# Altium footprint library Rocket_library.PcbLib: 65 footprints (part 1 of 5)
Each footprint in its own frame and in the unit in brackets; x right, y up, seen from the top. Pads: shape width x height; smd on the part's side, far side on the other; paste and mask are expansions set on the pad; w line width, h text height; cw(c..) or ccw(c..) is an arc to the next point about the centre after c.
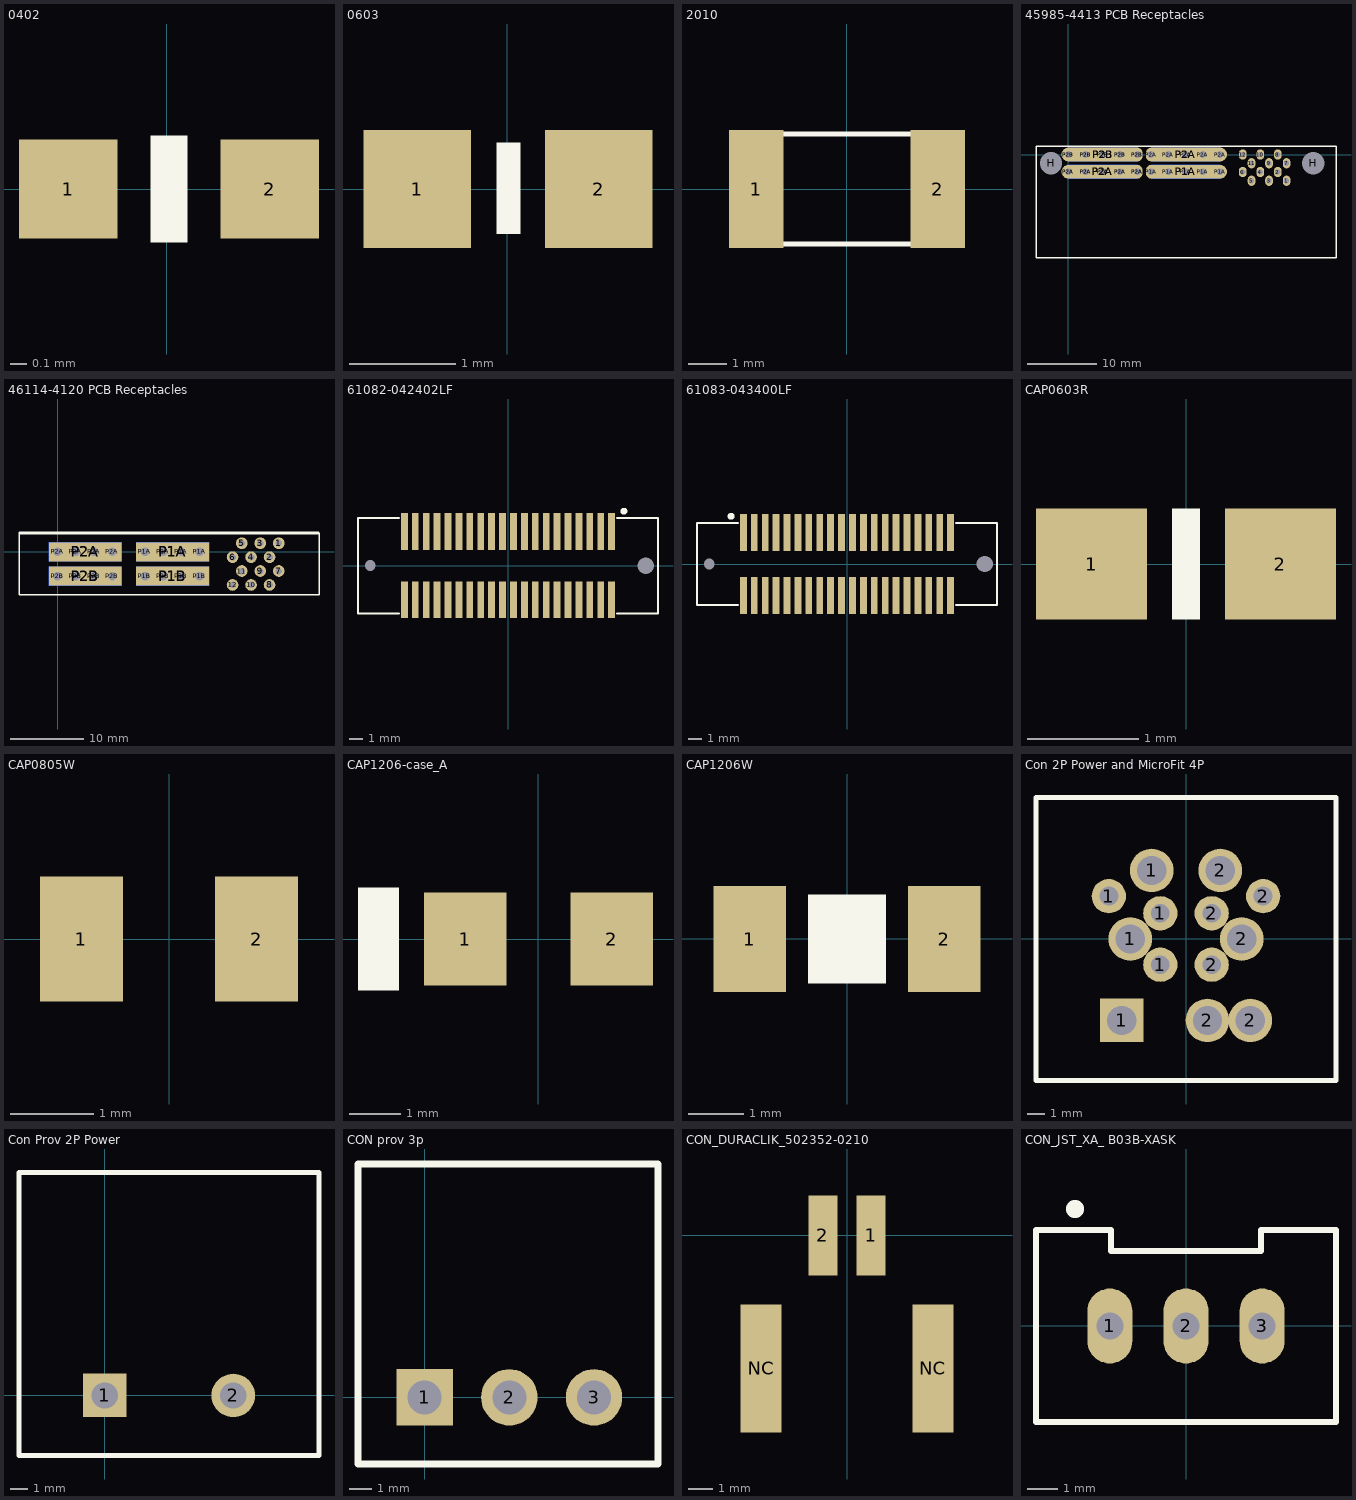
[diagram p0: the footprints below, top view; thin cyan lines are the x and y axes]

## 0402 [mm]
pads (2):
  rect 0.6x0.6 smd: 1(-0.6,0) 2(0.625,0)
Top Overlay:
  rectangle: -0.1,-0.325 0.125,0.325
3D body "CAP0402.stp": height 0.2, standoff 0, extent -0.5,-0.3 0.5,0.3

## 0603 [mil]
pads (2):
  rect 40x44 smd: 1(-33.46,0) 2(34,0)
Top Overlay:
  rectangle: -3.94,-16.73 4.92,17.27
3D body "User Library-RES_1609-0603.STEP": height 22.05, standoff 0, extent -33.46,-15.74 33.47,15.75

## 2010 [mil]
pads (2):
  rect 56x121 smd: 1(-92.52,0) 2(93,0)
Top Overlay:
  lines w5: -93.62,-56.1 94,-56.1 94,56.1 -93.62,56.1 -93.62,-56.1
3D body "User Library-R_2010.STEP": height 23.62, standoff 0, extent -98.42,-49.21 98.43,49.22

## 45985-4413 PCB Receptacles [mm] "EXTreme LPH Power™ Header, Right Angle, 4 Power Contacts, 12 Signal Contacts, Select Gold (Au) Plating, for 1.57mm Thick PC Board, with Guide Pockets, with Press-fit Plastic Pegs"
pads (56):
  oval 1.1x1.5 hole 0.75: 1(31.63,-3.81) 2(30.36,-2.54) 3(29.09,-3.81) 4(27.82,-2.54) 5(26.55,-3.81) 6(25.28,-2.54) 7(31.63,-1.27) 8(30.36,0) 9(29.09,-1.27) 10(27.82,0) 11(26.55,-1.27) 12(25.28,0)
  round 2 hole 3.2 unplated: H(-2.5,-1.27) H(35.5,-1.27)
  oval 1.5x2 hole 1: P1A(12,-2.5) P2A(10,-2.5) P2A(10,-2.5) P2A(12,0) P2B(10,0) P2B(10,0)
  round 2 hole 1: P1A(14.5,-2.5) P1A(17,-2.5) P1A(19.5,-2.5) P1A(22,-2.5) P2A(0,-2.5) P2A(0,-2.5) P2A(2.5,-2.5) P2A(2.5,-2.5) P2A(5,-2.5) P2A(5,-2.5) P2A(7.5,-2.5) P2A(7.5,-2.5) P2A(14.5,0) P2A(17,0) P2A(19.5,0) P2A(22,0) P2B(0,0) P2B(0,0) P2B(2.5,0) P2B(2.5,0) P2B(5,0) P2B(5,0) P2B(7.5,0) P2B(7.5,0)
  rect 10x2 smd: P1A(17,-2.5) P2A(5,-2.5) P2A(5,-2.5) P2A(17,0) P2B(5,0) P2B(5,0)
  rect 10x2 smd far side: P1A(17,-2.5) P2A(5,-2.5) P2A(5,-2.5) P2A(17,0) P2B(5,0) P2B(5,0)
Top Overlay:
  lines w0.2: -4.7,-15 38.8,-15 38.8,1.2 -4.7,1.2 -4.7,-15
3D body "459854413.stp": height 9.19, standoff -1.55, extent -4.805,-15.215 38.855,1.065

## 46114-4120 PCB Receptacles [mm] "1.27mm, 12.00mm Pitch, EXTreme LPHPower™ Receptacle Header, Vertical, 4 Power Contacts, 12 Signal Contacts, Select Gold (Au) Plating, with BMI Guides"
pads (36):
  round 1.6 hole 0.9: 1(30.38,1.19) 2(29.11,-0.72) 3(27.84,1.19) 4(26.57,-0.72) 5(25.3,1.19) 6(24.03,-0.72) 7(30.38,-2.63) 8(29.11,-4.54) 9(27.84,-2.63) 10(26.57,-4.54) 11(25.3,-2.63) 12(24.03,-4.54)
  round 2.184 hole 1.2: P1A(12,0) P1A(14.5,0) P1A(17,0) P1A(19.5,0) P1B(12,-3.33) P1B(14.5,-3.33) P1B(17,-3.33) P1B(19.5,-3.33) P2A(0,0) P2A(2.5,0) P2A(5,0) P2A(7.5,0) P2B(0,-3.33) P2B(2.5,-3.33) P2B(5,-3.33) P2B(7.5,-3.33)
  rect 10x2.6 smd: P1A(15.8,0) P1B(15.8,-3.33) P2A(3.8,0) P2B(3.8,-3.33)
  rect 10x2.6 smd far side: P1A(15.8,0) P1B(15.8,-3.33) P2A(3.8,0) P2B(3.8,-3.33)
Top Overlay:
  lines w0.2: -5.3,-5.9 35.9,-5.9 35.9,2.54 -5.3,2.54 -5.3,-5.9
  lines w0.4: -5.2,2.6 35.8,2.6
3D body "461144120.stp": height 18.02, standoff -2.57, extent -5.2,-5.8 35.805,2.53

## 61082-042402LF [mm] "Connecteurs carte à carte et mezzanine 40P RECPT"
pads (42):
  round 0 hole 0.8 unplated: 1(-10.1,0)
  rect 0.5x2.7 smd: 1(7.6,2.5) 2(7.6,-2.5) 3(6.8,2.5) 4(6.8,-2.5) 5(6,2.5) 6(6,-2.5) 7(5.2,2.5) 8(5.2,-2.5) 9(4.4,2.5) 10(4.4,-2.5) 11(3.6,2.5) 12(3.6,-2.5) 13(2.8,2.5) 14(2.8,-2.5) 15(2,2.5) 16(2,-2.5) 17(1.2,2.5) 18(1.2,-2.5) 19(0.4,2.5) 20(0.4,-2.5) 21(-0.4,2.5) 22(-0.4,-2.5) 23(-1.2,2.5) 24(-1.2,-2.5) 25(-2,2.5) 26(-2,-2.5) 27(-2.8,2.5) 28(-2.8,-2.5) 29(-3.6,2.5) 30(-3.6,-2.5) 31(-4.4,2.5) 32(-4.4,-2.5) 33(-5.2,2.5) 34(-5.2,-2.5) 35(-6,2.5) 36(-6,-2.5) 37(-6.8,2.5) 38(-6.8,-2.5) 39(-7.6,2.5) 40(-7.6,-2.5)
  round 0 hole 1.2 unplated: 1(10.1,0)
Top Overlay:
  circle w0.3: c8.5,4 r0.1
  lines w0.127: -8,-3.5 -11,-3.5 -11,3.5 -8,3.5 ; 8,-3.5 11,-3.5 11,3.5 8,3.5
3D body "s61082-042x0xxx.stp": height 7.65, standoff -0.7, extent -10.9,-3.4 10.9,3.4

## 61083-043400LF [mm] "Connecteurs carte à carte et mezzanine 6.70MM PLUG 40P"
pads (42):
  round 0 hole 0.8 unplated: 1(-10.1,0)
  rect 0.5x2.7 smd: 1(-7.6,2.3) 2(-7.6,-2.3) 3(-6.8,2.3) 4(-6.8,-2.3) 5(-6,2.3) 6(-6,-2.3) 7(-5.2,2.3) 8(-5.2,-2.3) 9(-4.4,2.3) 10(-4.4,-2.3) 11(-3.6,2.3) 12(-3.6,-2.3) 13(-2.8,2.3) 14(-2.8,-2.3) 15(-2,2.3) 16(-2,-2.3) 17(-1.2,2.3) 18(-1.2,-2.3) 19(-0.4,2.3) 20(-0.4,-2.3) 21(0.4,2.3) 22(0.4,-2.3) 23(1.2,2.3) 24(1.2,-2.3) 25(2,2.3) 26(2,-2.3) 27(2.8,2.3) 28(2.8,-2.3) 29(3.6,2.3) 30(3.6,-2.3) 31(4.4,2.3) 32(4.4,-2.3) 33(5.2,2.3) 34(5.2,-2.3) 35(6,2.3) 36(6,-2.3) 37(6.8,2.3) 38(6.8,-2.3) 39(7.6,2.3) 40(7.6,-2.3)
  round 0 hole 1.2 unplated: 1(10.1,0)
Top Overlay:
  circle w0.3: c-8.5,3.5 r0.1
  lines w0.127: -8,-3 -11,-3 -11,3 -8,3 ; 8,-3 11,-3 11,3 8,3
3D body "s61083-043x0xxx.stp": height 6.65, standoff -0.7, extent -10.9,-3 10.9,3

## CAP0603R [mm] "capacitor 0603 reflow soldering"
pads (2):
  rect 1x1 smd: 1(-0.85,0) 2(0.85,0)
Top Overlay:
  rectangle: -0.125,-0.5 0.125,0.5
3D body "CAP0603.stp": height 0.3, standoff 0, extent -0.8,-0.4 0.8,0.4

## CAP0805W [mm] "capacitor 0805 wave soldering"
pads (2):
  rect 1x1.5 smd: 1(-1.05,0) 2(1.05,0)
3D body "CAP0805.stp": height 0.78, standoff 0, extent -1,-0.625 1,0.625

## CAP1206-case_A [mil]
pads (2):
  rect 63x71 smd: 1(-55.98,0) 2(56,0)
Top Overlay:
  rectangle: -137.8,-39.37 -106.3,39.37
3D body "User Library-AVX_ACASE.step": height 67.32, standoff 0, extent -66.92,-33.07 66.93,33.08

## CAP1206W [mm] "capacitor 1206 wave soldering"
pads (2):
  rect 1.3x1.9 smd: 1(-1.75,0) 2(1.75,0)
Top Overlay:
  rectangle: -0.7,-0.8 0.7,0.8
3D body "CAP1206.stp": height 1, standoff 0, extent -1.6,-0.8 1.6,0.8

## Con 2P Power and MicroFit 4P [mm]
pads (13):
  round 2 hole 1.1: 1(-4.5,2.5) 1(-1.5,-1.5) 1(-1.5,1.5) 2(1.5,-1.5) 2(1.5,1.5) 2(4.5,2.5)
  rect 2.54x2.54 hole 1.7: 1(-3.75,-4.75)
  round 2.54 hole 1.7: 1(-3.25,0) 1(-2,4) 2(1.25,-4.75) 2(2,4) 2(3.25,0) 2(3.75,-4.75)
Top Overlay:
  lines w0.3: -8.75,-8.25 -8.75,8.25 8.75,8.25 8.75,-8.25 -8.75,-8.25
3D body "430450412.stp": height 9.95, standoff -3.14, extent -5.075,-3.97 5.075,4.8

## Con Prov 2P Power [mil]
pads (2):
  rect 100x100 hole 60: 1(0,0)
  round 100 hole 60: 2(295.28,0)
Top Overlay:
  lines w11.81: -196.85,-137.8 -196.85,511.81 492.13,511.81 492.13,-137.8 -196.85,-137.8

## CON prov 3p [mil]
pads (3):
  rect 100x100 hole 60: 1(0,0)
  round 100 hole 60: 2(150,0) 3(300,0)
Top Overlay:
  lines w11.81: -118.11,-118.11 -118.11,413.39 413.39,413.39 413.39,-118.11 -118.11,-118.11

## CON_DURACLIK_502352-0210 [mm] "Embases Hdr Singl Row RA 2Ckt Natural Gold 3A"
pads (4):
  rect 1.2x3.3 smd: 1(1,0) 2(-1,0)
  rect 1.7x5.3 smd: NC(-3.55,-5.5) NC(3.55,-5.5)
3D body "5023520210.stp": height 6.36, standoff -0.04, extent -4,-8.4 4,1

## CON_JST_XA_ B03B-XASK [mm] "Embases Hdr Singl Row 3Ckt 3A"
pads (3):
  oval 1.5x2.5 hole 0.9: 1(-2.54,0) 2(0,0) 3(2.54,0)
Top Overlay:
  circle w0.4: c-3.7,3.9 r0.1
  lines w0.2: -5,-3.2 5,-3.2 5,3.2 2.5,3.2 2.5,2.5 -2.5,2.5 -2.5,3.2 -5,3.2 -5,-3.2
3D body "B03B-XASK-1.STEP": height 8.8, standoff -3.4, extent -5,-3.2 5,3.2